# Altium footprint library ACTION_IC封装.PcbLib: 114 footprints (part 3 of 8)
Each footprint in its own frame and in the unit in brackets; x right, y up, seen from the top. Pads: shape width x height; smd on the part's side, far side on the other; paste and mask are expansions set on the pad; w line width, h text height; cw(c..) or ccw(c..) is an arc to the next point about the centre after c.
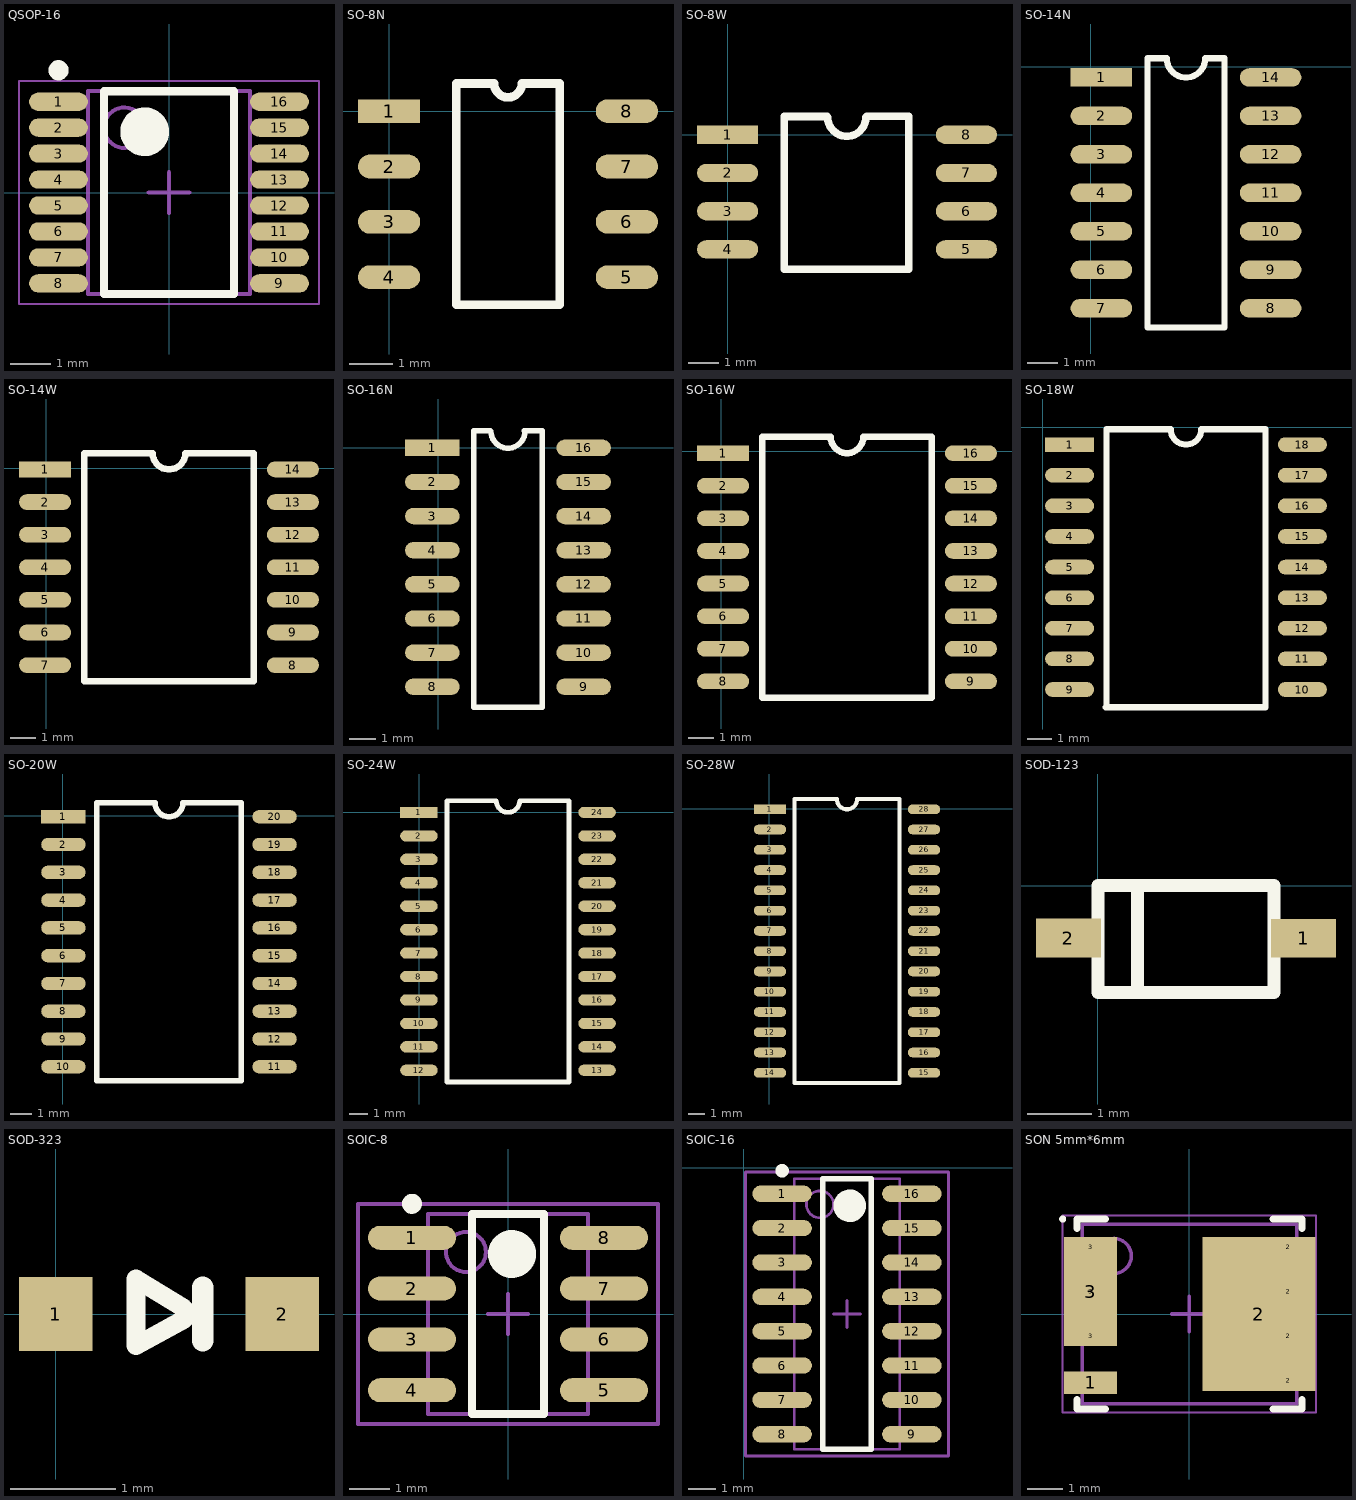
[diagram p2: the footprints below, top view; thin cyan lines are the x and y axes]

## QSOP-16 [mm]
height 1.75
pads (16):
  oval 1.45x0.45 smd: 1(-2.725,2.24) 2(-2.725,1.6) 3(-2.725,0.96) 4(-2.725,0.32) 5(-2.725,-0.32) 6(-2.725,-0.96) 7(-2.725,-1.6) 8(-2.725,-2.24) 9(2.725,-2.24) 10(2.725,-1.6) 11(2.725,-0.96) 12(2.725,-0.32) 13(2.725,0.32) 14(2.725,0.96) 15(2.725,1.6) 16(2.725,2.24)
Top Overlay:
  circle w0.25: c-2.725,3.015 r0.125
  circle w0.6: c-0.6,1.5 r0.3
  lines w0.2: -1.6,-2.5 -1.6,2.5 1.6,2.5 1.6,-2.5 -1.6,-2.5
Mechanical 13:
  circle w0.1: c-1.1,1.6 r0.5
  lines w0.1: -2,-2.5 -2,2.5 2,2.5 2,-2.5 -2,-2.5
Mechanical 15:
  lines w0.05: -3.7,-2.75 -3.7,2.75 3.7,2.75 3.7,-2.75 -3.7,-2.75
  lines w0.1: -0.5,0 0.5,0 ; 0,-0.5 0,0.5
3D body: height 1.75, standoff 0.1, extent -2,-2.5 2,2.5

## SO-8N [mm]
pads (8):
  rect 1.44x0.55 smd: 1(0,0)
  oval 1.44x0.55 smd: 2(0,-1.28) 3(0,-2.56) 4(0,-3.84) 5(5.5,-3.84) 6(5.5,-2.56) 7(5.5,-1.28) 8(5.5,0)
Top Overlay:
  lines w0.2: 1.555,-4.48 1.555,0.64 2.43,0.64 ccw(c2.75,0.64) 3.07,0.64 3.945,0.64 3.945,-4.48 1.555,-4.48
3D body "SOIC8.STEP": height 1.6, standoff 0, extent -0.201,-4.44 5.841,0.58

## SO-8W [mil]
pads (8):
  rect 80x24 smd: 1(0,0)
  oval 80x24 smd: 2(0,-50) 3(0,-100) 4(0,-150) 5(312.6,-150) 6(312.6,-100) 7(312.6,-50) 8(312.6,0)
Top Overlay:
  lines w10: 130.06,23.94 74.39,23.94 74.39,-176.06 237.01,-176.06 ; 131,23 ccw(c156,23) 181,23 ; 182,24 237.01,24 ; 236.01,23 237.01,24 ; 237.01,-176 237.01,24
3D body "User Library-SO-8W.STEP": height 76.77, standoff 0, extent 11.5,-179.33 322.52,29.33

## SO-14N [mil]
pads (14):
  rect 80x24 smd: 1(14,-14)
  oval 80x24 smd: 2(14,-64) 3(14,-114) 4(14,-164) 5(14,-214) 6(14,-264) 7(14,-314) 8(234,-314) 9(234,-264) 10(234,-214) 11(234,-164) 12(234,-114) 13(234,-64) 14(234,-14)
Top Overlay:
  lines w8: 74,-339 74,11 99,11 ccw(c124,11) 149,11 174,11 174,-339 74,-339
3D body "SOIC14.STEP": height 76.77, standoff 0, extent 6,-334.26 244.41,8.26

## SO-14W [mil]
pads (14):
  rect 80x24 smd: 1(-2,-2)
  oval 80x24 smd: 2(-2,-52) 3(-2,-102) 4(-2,-152) 5(-2,-202) 6(-2,-252) 7(-2,-302) 8(378,-302) 9(378,-252) 10(378,-202) 11(378,-152) 12(378,-102) 13(378,-52) 14(378,-2)
Top Overlay:
  lines w10: 58,-327 318,-327 318,23 213,23 cw(c188,23) 163,23 58,23 58,-327
3D body "User Library-SO-14W.STEP": height 102.36, standoff 0, extent -11.74,-333.14 395.74,25.13

## SO-16N [mil]
pads (16):
  rect 80x24 smd: 1(-9,0.1)
  oval 80x24 smd: 2(-9,-49.9) 3(-9,-99.9) 4(-9,-149.9) 5(-9,-199.9) 6(-9,-249.9) 7(-9,-299.9) 8(-9,-349.9) 9(212.9,-349.9) 10(212.9,-299.9) 11(212.9,-249.9) 12(212.9,-199.9) 13(212.9,-149.9) 14(212.9,-99.9) 15(212.9,-49.9) 16(212.9,0.1)
Top Overlay:
  lines w8: 51.9,24.72 51.9,-379.9 151.9,-379.9 151.9,24.72 ; 51.9,25.1 76,25.1 ; 76.9,24.72 ccw(c101.9,24.72) 126.9,24.72 ; 126,25.1 151.9,25.1
3D body "SOIC16.STEP": height 76.77, standoff 0, extent -21.2,-378.75 217.21,26.76

## SO-16W [mil]
pads (16):
  rect 80x24 smd: 1(3,-3)
  oval 80x24 smd: 2(3,-53) 3(3,-103) 4(3,-153) 5(3,-203) 6(3,-253) 7(3,-303) 8(3,-353) 9(383,-353) 10(383,-303) 11(383,-253) 12(383,-203) 13(383,-153) 14(383,-103) 15(383,-53) 16(383,-3)
Top Overlay:
  lines w10: 167.72,22 63,22 63,-378 323,-378 323,22 218,22 cw(c193,22) 168,22
3D body "User Library-SO-16W.STEP": height 97.64, standoff 0, extent -7,-380.35 398.91,26.35

## SO-18W [mil]
pads (18):
  rect 80x24 smd: 1(44,-28)
  oval 80x24 smd: 2(44,-78) 3(44,-128) 4(44,-178) 5(44,-228) 6(44,-278) 7(44,-328) 8(44,-378) 9(44,-428) 10(424,-428) 11(424,-378) 12(424,-328) 13(424,-278) 14(424,-228) 15(424,-178) 16(424,-128) 17(424,-78) 18(424,-28)
Top Overlay:
  lines w10: 103,-457 363,-457 ; 104,-457 104,-3 209,-3 ccw(c234,-3) 259,-3 364,-3 364,-457
3D body "User Library-SO-18W.STEP": height 97.64, standoff 0, extent 34.05,-451.95 439.96,3.95

## SO-20W [mil]
pads (20):
  rect 80x24 smd: 1(1,-2)
  oval 80x24 smd: 2(1,-52) 3(1,-102) 4(1,-152) 5(1,-202) 6(1,-252) 7(1,-302) 8(1,-352) 9(1,-402) 10(1,-452) 11(381,-452) 12(381,-402) 13(381,-352) 14(381,-302) 15(381,-252) 16(381,-202) 17(381,-152) 18(381,-102) 19(381,-52) 20(381,-2)
Top Overlay:
  lines w10: 61,-477 321,-477 321,23 216,23 cw(c191,23) 166,23 61,23 61,-477
3D body "User Library-SO-20W.STEP": height 97.64, standoff 0, extent -9.95,-480.37 395.96,24.36

## SO-24W [mil]
pads (24):
  rect 80x24 smd: 1(-1,0)
  oval 80x24 smd: 2(-1,-50) 3(-1,-100) 4(-1,-150) 5(-1,-200) 6(-1,-250) 7(-1,-300) 8(-1,-350) 9(-1,-400) 10(-1,-450) 11(-1,-500) 12(-1,-550) 13(379,-550) 14(379,-500) 15(379,-450) 16(379,-400) 17(379,-350) 18(379,-300) 19(379,-250) 20(379,-200) 21(379,-150) 22(379,-100) 23(379,-50) 24(379,0)
Top Overlay:
  lines w10: 59,-575 59,25 164,25 ccw(c189,25) 214,25 319,25 319,-575 59,-575
3D body "User Library-SO-24W.STEP": height 97.64, standoff 0, extent -32.95,-577.69 372.95,29

## SO-28W [mil]
pads (28):
  rect 80x24 smd: 1(2,-1)
  oval 80x24 smd: 2(2,-51) 3(2,-101) 4(2,-151) 5(2,-201) 6(2,-251) 7(2,-301) 8(2,-351) 9(2,-401) 10(2,-451) 11(2,-501) 12(2,-551) 13(2,-601) 14(2,-651) 15(382,-651) 16(382,-601) 17(382,-551) 18(382,-501) 19(382,-451) 20(382,-401) 21(382,-351) 22(382,-301) 23(382,-251) 24(382,-201) 25(382,-151) 26(382,-101) 27(382,-51) 28(382,-1)
Top Overlay:
  lines w10: 62,-676 62,24 167,24 ccw(c192,24) 217,24 322,24 322,-676 62,-676
3D body "SOIC28.STEP": height 104.33, standoff 0, extent -17.76,-677 387.76,27.72

## SOD-123 [mm]
pads (2):
  rect 1x0.6 smd: 1(3.175,-0.813) 2(-0.457,-0.813)
Top Overlay:
  lines w0.198: 0.61,-1.6 0.61,-0.025 ; 2.7,0 0,0 0,-1.65 2.717,-1.65 2.718,-1.651 2.718,0
3D body "SOD123.STEP": height 1.27, standoff 0, extent -0.427,-1.587 3.273,0.013

## SOD-323 [mm]
pads (2):
  rect 0.7x0.7 smd: 1(0,0) 2(2.15,0)
Top Overlay:
  lines w0.178: 1.221,-0.05 0.762,-0.3 0.762,0.332 1.221,0.05
  lines w0.203: 1.397,-0.254 1.397,0.254
3D body: height 1.5, standoff 0, extent 0,-0.584 2.108,0.559

## SOIC-8 [mm] "SOIC, 8-Leads, Body 5.0x4.0mm (max), Pitch 1.27mm, IPC Medium Density"
height 1.75
pads (8):
  oval 2.2x0.6 smd: 1(-2.4,1.905) 2(-2.4,0.635) 3(-2.4,-0.635) 4(-2.4,-1.905) 5(2.4,-1.905) 6(2.4,-0.635) 7(2.4,0.635) 8(2.4,1.905)
Top Overlay:
  circle w0.25: c-2.4,2.755 r0.125
  circle w0.6: c0.1,1.5 r0.3
  lines w0.2: -0.9,-2.5 -0.9,2.5 0.9,2.5 0.9,-2.5 -0.9,-2.5
Mechanical 13:
  circle w0.1: c-1.05,1.55 r0.5
  lines w0.1: -2,-2.5 -2,2.5 2,2.5 2,-2.5 -2,-2.5
Mechanical 15:
  lines w0.1: -0.5,0 0.5,0 ; 0,-0.5 0,0.5 ; -3.75,-2.75 -3.75,2.75 3.75,2.75 3.75,-2.75 -3.75,-2.75
3D body "SOIC8.STEP": height 1.6, standoff 0, extent -2.995,-2.535 3.046,2.485

## SOIC-16 [mm] "SOIC, 16-Leads, Body 10.0x3.9mm (max), Pitch 1.27mm, IPC Medium Density"
height 1.5
pads (16):
  oval 2.2x0.6 smd: 1(1.41,-0.965) 2(1.41,-2.235) 3(1.41,-3.505) 4(1.41,-4.775) 5(1.41,-6.045) 6(1.41,-7.315) 7(1.41,-8.585) 8(1.41,-9.855) 9(6.21,-9.855) 10(6.21,-8.585) 11(6.21,-7.315) 12(6.21,-6.045) 13(6.21,-4.775) 14(6.21,-3.505) 15(6.21,-2.235) 16(6.21,-0.965)
Top Overlay:
  circle w0.6: c3.91,-1.41 r0.3
  circle w0.25: c1.41,-0.115 r0.125
  lines w0.2: 2.91,-10.41 4.71,-10.41 4.71,-0.41 2.91,-0.41 2.91,-10.41
Mechanical 13:
  circle w0.1: c2.81,-1.36 r0.5
  lines w0.1: 1.86,-10.41 5.76,-10.41 5.76,-0.41 1.86,-0.41 1.86,-10.41
Mechanical 15:
  lines w0.1: 3.31,-5.41 4.31,-5.41 ; 3.81,-5.91 3.81,-4.91 ; 0.06,-10.66 7.56,-10.66 7.56,-0.16 0.06,-0.16 0.06,-10.66
3D body "SOIC16.STEP": height 1.95, standoff 0, extent 0.757,-10.611 6.813,-0.311

## SON 5mm*6mm [mm]
height 0.8
pads (10):
  rect 1.5x0.65 smd: 1(-2.81,-1.956)
  rect 3.2x4.38 smd: 2(1.981,0)
  rect 1.05x0.25 smd: 2(2.81,-1.905) 2(2.81,-0.635) 2(2.81,0.635) 2(2.81,1.905) 3(-2.81,-0.635) 3(-2.81,0.635) 3(-2.81,1.905)
  rect 1.5x3.1 smd: 3(-2.81,0.635)
Top Overlay:
  circle w0.1: c-3.6,2.7 r0.05
  lines w0.2: -3.2,-2.43 -3.2,-2.7 -2.385,-2.7 ; -3.2,2.43 -3.2,2.7 -2.385,2.7 ; 2.385,-2.7 3.2,-2.7 3.2,-2.43 ; 2.385,2.7 3.2,2.7 3.2,2.43
Mechanical 13:
  circle w0.1: c-2.15,1.65 r0.5
  lines w0.1: -3.05,-2.55 3.05,-2.55 3.05,2.55 -3.05,2.55 -3.05,-2.55
Mechanical 15:
  lines w0.05: -3.605,-2.8 3.605,-2.8 3.605,2.8 -3.605,2.8 -3.605,-2.8
  lines w0.1: -0.5,0 0.5,0 ; 0,-0.5 0,0.5
3D body: height 0.8, standoff 0.15, extent -3.05,-2.55 3.05,2.55